# Altium footprint library biblioteka_pcb.PcbLib: 184 footprints (part 8 of 12)
Each footprint in its own frame and in the unit in brackets; x right, y up, seen from the top. Pads: shape width x height; smd on the part's side, far side on the other; paste and mask are expansions set on the pad; w line width, h text height; cw(c..) or ccw(c..) is an arc to the next point about the centre after c.
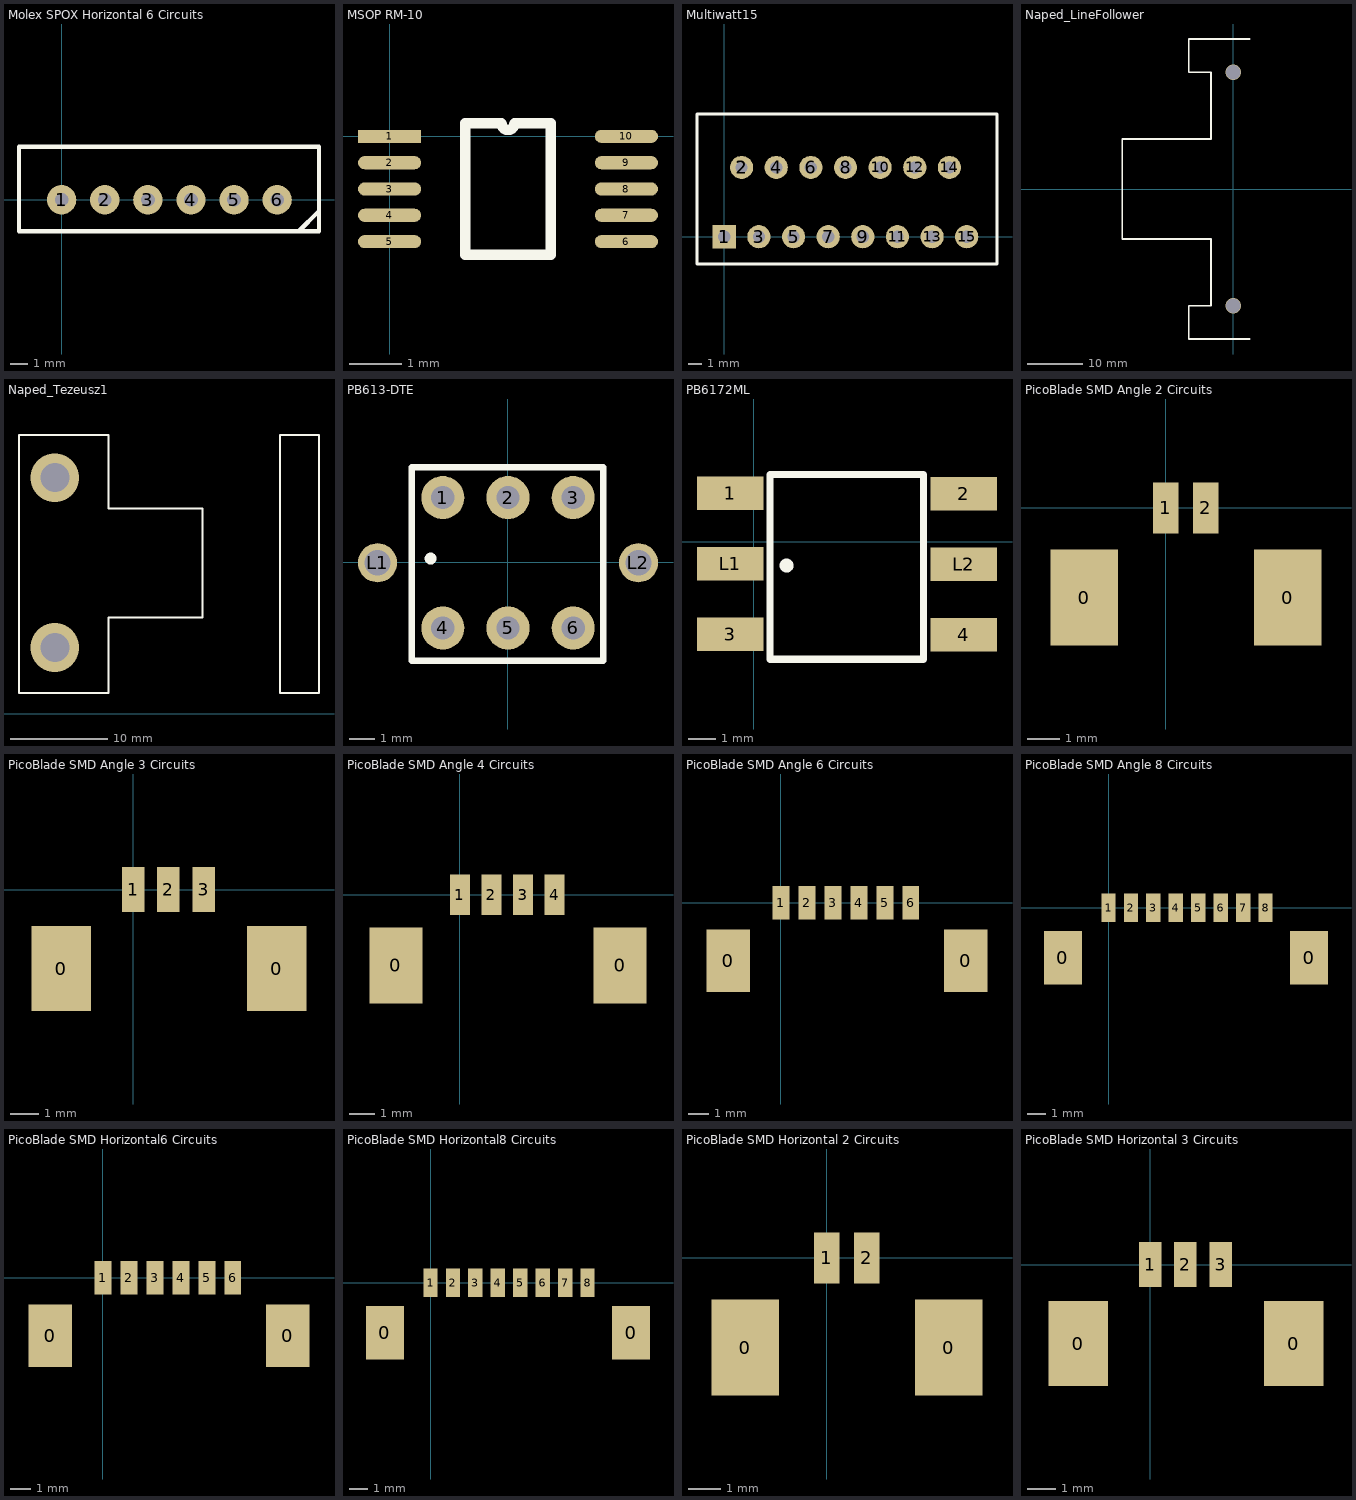
[diagram p7: the footprints below, top view; thin cyan lines are the x and y axes]

## Molex SPOX Horizontal 6 Circuits [mm]
pads (6):
  round 1.7 hole 0.8: 1(0,0) 2(2.5,0) 3(5,0) 4(7.5,0) 5(10,0) 6(12.5,0)
Top Overlay:
  lines w0.254: 13.75,-1.825 14.9,-0.675 ; -2.475,-1.825 14.925,-1.825 14.925,3.075 -2.475,3.075 -2.475,-1.825
3D body "022035065.stp": height 5.9, standoff -3.5, extent -2.475,-1.825 14.925,3.075

## MSOP RM-10 [mm]
pads (10):
  rect 1.2x0.25 smd: 1(0,0)
  oval 1.2x0.25 smd: 2(0,-0.5) 3(0,-1) 4(0,-1.5) 6(4.5,-2) 7(4.5,-1.5) 8(4.5,-1) 9(4.5,-0.5) 10(4.5,0)
  oval 1.2x0.25 smd mask+0.102: 5(0,-2)
Top Overlay:
  lines w0.2: 1.435,-2.25 3.065,-2.25 3.065,0.25 2.375,0.25 cw(c2.25,0.25) 2.125,0.25 1.435,0.25 1.435,-2.25
Top Solder:
  rectangle: -0.5,-2 0.5,0
  rectangle: 4,-2 5,0

## Multiwatt15 [mm] "Miltiwatt15, 15-leads package"
pads (17):
  rect 1.7x1.7 hole 0.9: 1(0,0) 1(0,0)
  round 1.7 hole 0.9: 2(1.27,5.08) 2(1.27,5.08) 3(2.54,0) 4(3.81,5.08) 5(5.08,0) 6(6.35,5.08) 7(7.62,0) 8(8.89,5.08) 9(10.16,0) 10(11.43,5.08) 11(12.7,0) 12(13.97,5.08) 13(15.24,0) 14(16.51,5.08) 15(17.78,0)
Top Overlay:
  lines w0.254: -2,-2 20,-2 20,9 -2,9 -2,-2
3D body "Multiwatt15V.stp": height 22, standoff -1, extent -0.875,-0.251 18.605,8.549

## Naped_LineFollower [mm]
via 0,21 diameter 2.8 hole 2.6
via 0,-21 diameter 2.8 hole 2.6
Top Overlay:
  lines w0.3: 3,-27 -8,-27 -8,-21 -4,-21 -4,-9 -20,-9 -20,0 -20,9 -4,9 -4,21 -8,21 -8,27 3,27
3D body "asm.1717_mocowanie_wheel.stp": height 23.35, standoff -4.95, extent -19.505,-26.5 16.895,26.483

## Naped_Tezeusz1 [mm] "Naped bez enkodera do Tezeusza1, dopasowac pozniej do holes w main PCB"
via 14.2,24.3 diameter 5 hole 3
via 14.2,6.8 diameter 5 hole 3
Top Overlay:
  lines w0.2: 10.5,2.1 19.7,2.1 19.7,9.9 29.4,9.9 29.4,21.1 19.7,21.1 19.7,28.7 10.5,28.7 10.5,2.1 ; 37.4,2.1 37.4,28.7 41.4,28.7 41.4,2.1 37.4,2.1
3D body "naped_bez_enkodera.stp": height 27.12, standoff -4.32, extent 0,0 41.5,31.376

## PB613-DTE [mm]
pads (8):
  round 1.676 hole 0.9: 1(-2.525,2.525) 2(0.015,2.525) 3(2.555,2.525) 4(-2.525,-2.555) 5(0.015,-2.555) 6(2.555,-2.555)
  round 1.524 hole 1: L1(-5.065,-0.015) L2(5.095,-0.015)
Top Overlay:
  circle w0.254: c-3,0.15 r0.103
  lines w0.254: -3.725,-3.825 -3.725,3.7 3.725,3.7 3.725,-3.825 -3.725,-3.825

## PB6172ML [mm]
pads (6):
  rect 2.4x1.2 smd: 1(-0.85,1.75) 2(7.55,1.74) 3(-0.85,-3.33) 4(7.55,-3.34) L1(-0.85,-0.79) L2(7.55,-0.8)
Top Overlay:
  circle w0.254: c1.175,-0.85 r0.125
  lines w0.254: 0.575,-4.225 0.575,2.425 6.1,2.425 6.1,-4.225 0.575,-4.225

## PicoBlade SMD Angle 2 Circuits [mm]
pads (4):
  rect 2.1x3 smd: 0(-2.54,-2.794) 0(3.81,-2.794)
  rect 0.8x1.6 smd: 1(0,0) 2(1.25,0)
3D body "532610271.stp": height 3.4, standoff 0, extent -3.175,-4.946 4.475,0.254

## PicoBlade SMD Angle 3 Circuits [mm]
pads (5):
  rect 2.1x3 smd: 0(-2.54,-2.794) 0(5.08,-2.794)
  rect 0.8x1.6 smd: 1(0,0) 2(1.25,0) 3(2.5,0)
3D body "532610371.stp": height 3.4, standoff 0, extent -3.302,-4.692 5.598,0.508

## PicoBlade SMD Angle 4 Circuits [mm]
pads (6):
  rect 2.1x3 smd: 0(-2.54,-2.794) 0(6.35,-2.794)
  rect 0.8x1.6 smd: 1(0,0) 2(1.25,0) 3(2.5,0) 4(3.75,0)
3D body "532610471.stp": height 3.4, standoff 0, extent -3.302,-4.692 6.848,0.508

## PicoBlade SMD Angle 6 Circuits [mm]
pads (8):
  rect 2.1x3 smd: 0(-2.54,-2.794) 0(8.89,-2.794)
  rect 0.8x1.6 smd: 1(0,0) 2(1.25,0) 3(2.5,0) 4(3.75,0) 5(5,0) 6(6.25,0)
3D body "532610671.stp": height 3.4, standoff 0, extent -3.302,-4.692 9.348,0.508

## PicoBlade SMD Angle 8 Circuits [mm]
pads (10):
  rect 2.1x3 smd: 0(-2.54,-2.794) 0(11.176,-2.794)
  rect 0.8x1.6 smd: 1(0,0) 2(1.25,0) 3(2.5,0) 4(3.75,0) 5(5,0) 6(6.25,0) 7(7.5,0) 8(8.75,0)
3D body "532610871.stp": height 3.4, standoff 0, extent -3.302,-4.692 11.848,0.508

## PicoBlade SMD Horizontal6 Circuits [mm]
pads (8):
  rect 2.1x3 smd: 0(-2.54,-2.794) 0(8.89,-2.794)
  rect 0.8x1.6 smd: 1(0,0) 2(1.25,0) 3(2.5,0) 4(3.75,0) 5(5,0) 6(6.25,0)
3D body "533980671.stp": height 4.7, standoff 0, extent -3.277,-4.009 9.373,0.191

## PicoBlade SMD Horizontal8 Circuits [mm]
pads (10):
  rect 2.1x3 smd: 0(-2.54,-2.794) 0(11.176,-2.794)
  rect 0.8x1.6 smd: 1(0,0) 2(1.25,0) 3(2.5,0) 4(3.75,0) 5(5,0) 6(6.25,0) 7(7.5,0) 8(8.75,0)
3D body "533980871.stp": height 4.7, standoff 0, extent -3.175,-4.005 11.975,0.195

## PicoBlade SMD Horizontal 2 Circuits [mm]
pads (4):
  rect 2.1x3 smd: 0(-2.54,-2.794) 0(3.81,-2.794)
  rect 0.8x1.6 smd: 1(0,0) 2(1.25,0)
3D body "533980271.stp": height 4.7, standoff 0, extent -3.175,-3.946 4.475,0.254

## PicoBlade SMD Horizontal 3 Circuits [mm]
pads (5):
  rect 2.1x3 smd: 0(-2.54,-2.794) 0(5.08,-2.794)
  rect 0.8x1.6 smd: 1(0,0) 2(1.25,0) 3(2.5,0)
3D body "533980371.stp": height 4.7, standoff 0, extent -3.18,-3.882 5.72,0.318